# Altium footprint library AMA4B_adapter_board.PcbLib: 73 footprints (part 3 of 5)
Each footprint in its own frame and in the unit in brackets; x right, y up, seen from the top. Pads: shape width x height; smd on the part's side, far side on the other; paste and mask are expansions set on the pad; w line width, h text height; cw(c..) or ccw(c..) is an arc to the next point about the centre after c.
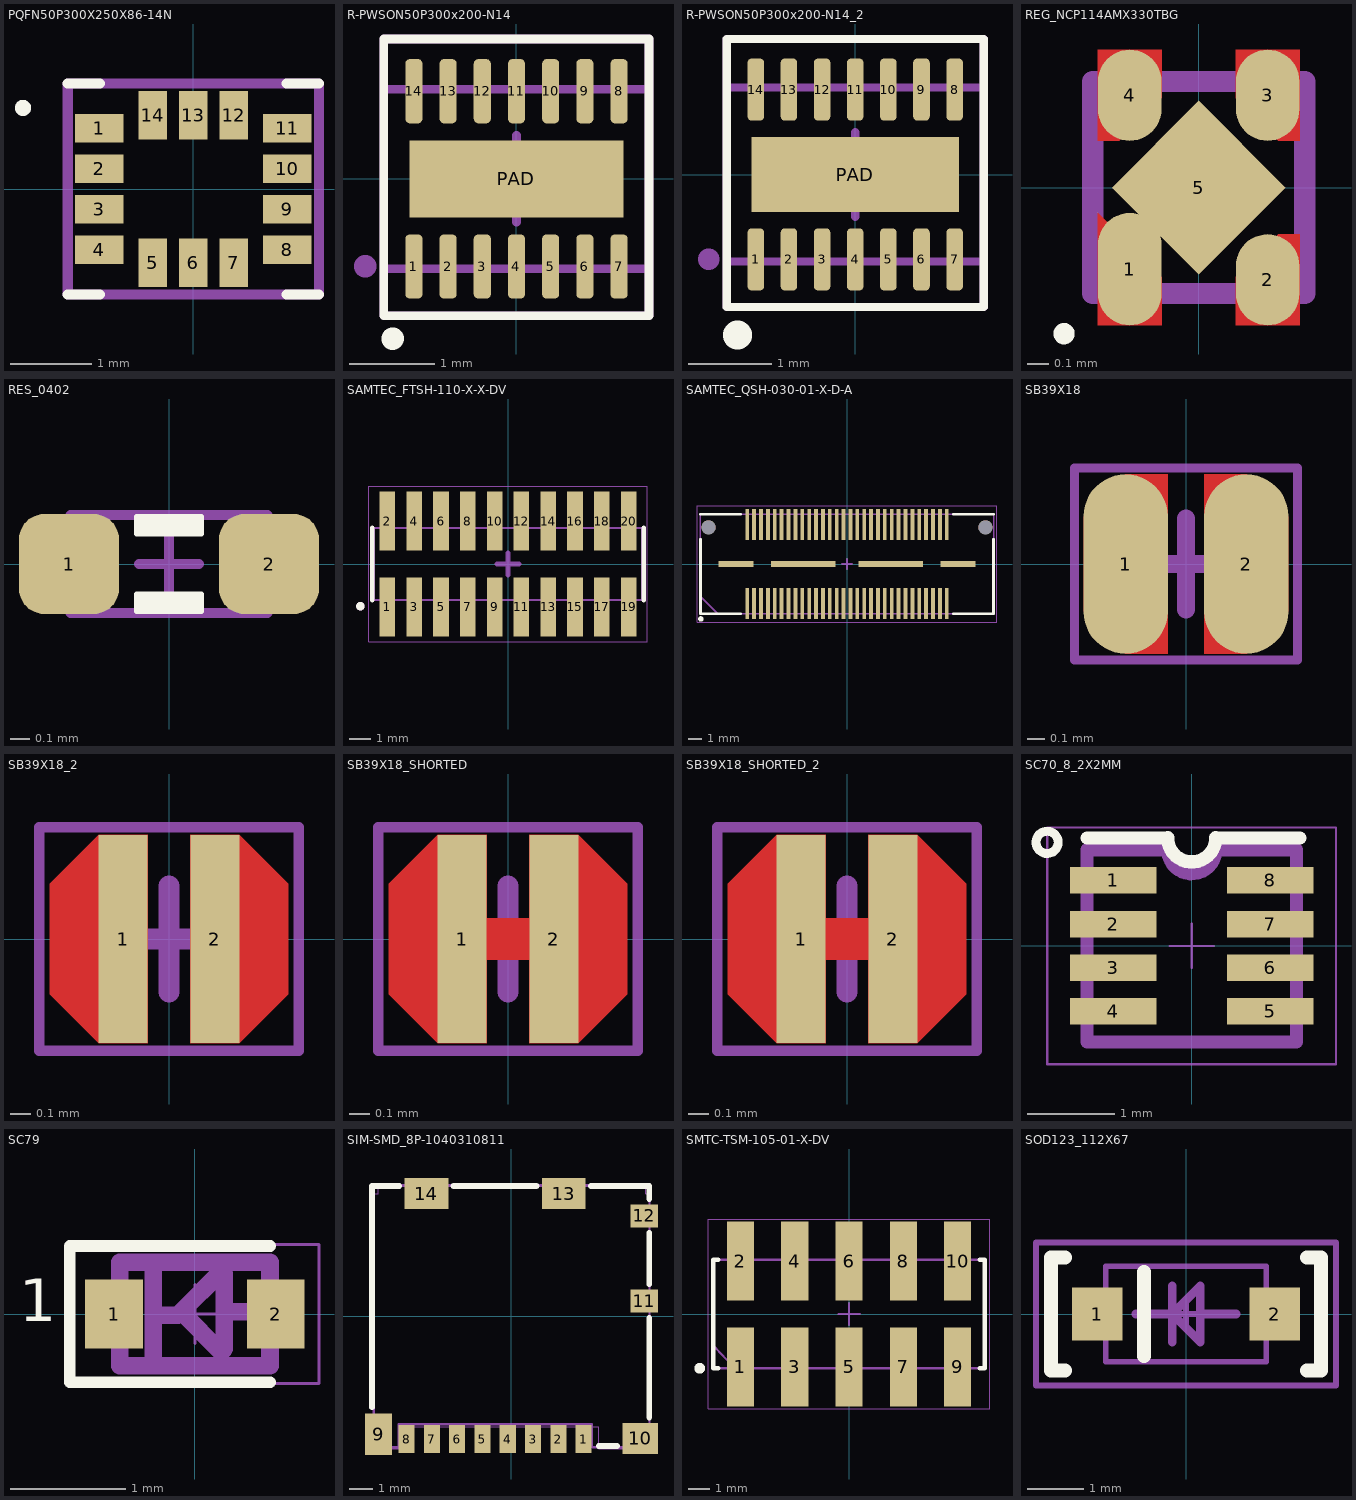
[diagram p2: the footprints below, top view; thin cyan lines are the x and y axes]

## PQFN50P300X250X86-14N [mm]
pads (14):
  rect 0.6x0.35 smd: 1(-1.16,0.75) 2(-1.16,0.25) 3(-1.16,-0.25) 4(-1.16,-0.75) 8(1.16,-0.75) 9(1.16,-0.25) 10(1.16,0.25) 11(1.16,0.75)
  rect 0.35x0.6 smd: 5(-0.5,-0.91) 6(0,-0.91) 7(0.5,-0.91) 12(0.5,0.91) 13(0,0.91) 14(-0.5,0.91)
Top Overlay:
  circle w0.1: c-2.1,1 r0.05
  lines w0.127: -1.55,-1.3 -1.15,-1.3 ; -1.55,1.3 -1.15,1.3 ; 1.15,-1.3 1.55,-1.3 ; 1.15,1.3 1.55,1.3
Top Assembly:
  lines w0.127: -1.55,-1.3 1.55,-1.3 1.55,1.3 -1.55,1.3 -1.55,-1.3
  text ".Designator" at -1.126,-0.113 h0.5
3D body "step_temp.STEP": height 0.86, standoff 0, extent -1.5,-1.25 1.5,1.25

## R-PWSON50P300x200-N14 [mm] "Texas Instruments DPU Package"
pads (15):
  rrect50% 0.2x0.75 smd mask+0.05: 1(-1.2,-1.025) 2(-0.8,-1.025) 3(-0.4,-1.025) 4(0,-1.025) 5(0.4,-1.025) 6(0.8,-1.025) 7(1.2,-1.025) 8(1.2,1.025) 9(0.8,1.025) 10(0.4,1.025) 11(0,1.025) 12(-0.4,1.025) 13(-0.8,1.025) 14(-1.2,1.025)
  rect 2.5x0.9 smd paste-1 mask+0.05: PAD(0,0)
Top Overlay:
  circle w0.254: c-1.449,-1.869 r0.004
  lines w0.1: -1.55,-1.6 1.55,-1.6 1.55,1.636 -1.55,1.636 -1.55,-1.6
Top Paste:
  rectangle: 0.125,-0.375 1.125,0.375
  rectangle: -1.125,-0.375 -0.125,0.375
Board Shape:
  circle w0.254: c-1.77,-1.023 r0.004
  lines w0.1: -1.55,-1.05 1.55,-1.05 1.55,1.05 -1.55,1.05 -1.55,-1.05
  text ".Designator" at 3.379,0.463 h1.52
Top Courtyard:
  lines w0.1: -1.55,-1.6 -1.55,1.636 1.55,1.636 1.55,-1.6 -1.55,-1.6
Top Component Center:
  lines w0.102: -0.508,0 0.508,0 ; 0,-0.508 0,0.508
3D body: height 0.8, standoff 0, extent -1.55,-1.05 1.55,1.05

## R-PWSON50P300x200-N14_2 [mm]
pads (15):
  rrect50% 0.2x0.75 smd mask+0.05: 1(-1.2,-1.025) 2(-0.8,-1.025) 3(-0.4,-1.025) 4(0,-1.025) 5(0.4,-1.025) 6(0.8,-1.025) 7(1.2,-1.025) 8(1.2,1.025) 9(0.8,1.025) 10(0.4,1.025) 11(0,1.025) 12(-0.4,1.025) 13(-0.8,1.025) 14(-1.2,1.025)
  rect 2.5x0.9 smd paste-1 mask+0.05: PAD(0,0)
Top Overlay:
  circle w0.254: c-1.421,-1.938 r0.048
  lines w0.1: -1.55,-1.6 1.55,-1.6 1.55,1.636 -1.55,1.636 -1.55,-1.6
Top Paste:
  rectangle: 0.125,-0.375 1.125,0.375
  rectangle: -1.125,-0.375 -0.125,0.375
Board Shape:
  circle w0.254: c-1.77,-1.023 r0.004
  lines w0.1: -1.55,-1.05 1.55,-1.05 1.55,1.05 -1.55,1.05 -1.55,-1.05
  text ".Designator" at 3.459,0.345 h1.52
Top Courtyard:
  lines w0.1: -1.55,-1.6 -1.55,1.636 1.55,1.636 1.55,-1.6 -1.55,-1.6
Top Component Center:
  lines w0.102: -0.508,0 0.508,0 ; 0,-0.508 0,0.508
3D body: height 0.8, standoff 0, extent -1.55,-1.05 1.55,1.05

## REG_NCP114AMX330TBG [mm]
pads (5):
  shape10 0.3x0.53 smd: 1(-0.325,-0.385)
  shape10 0.3x0.43 smd: 2(0.325,-0.435) 3(0.325,0.435) 4(-0.325,0.435)
  rect 0.58x0.58 smd rot 45 mask+0: 5(0,0)
Top Layer:
  region: 0.475,0.22 0.375,0.22 0.175,0.42 0.175,0.65 0.475,0.65
  region: -0.175,0.42 -0.375,0.22 -0.475,0.22 -0.475,0.65 -0.175,0.65
  region: -0.175,-0.42 -0.175,-0.65 -0.475,-0.65 -0.475,-0.12
  region: 0.475,-0.65 0.175,-0.65 0.175,-0.42 0.375,-0.22 0.475,-0.22
Top Overlay:
  circle w0.05: c-0.635,-0.689 r0.025
Top Paste:
  region: -0.175,0.42 -0.375,0.22 -0.475,0.22 -0.475,0.65 -0.175,0.65
  region: 0.475,0.22 0.375,0.22 0.175,0.42 0.175,0.65 0.475,0.65
  region: 0.475,-0.65 0.175,-0.65 0.175,-0.42 0.375,-0.22 0.475,-0.22
  region: -0.175,-0.42 -0.175,-0.65 -0.475,-0.65 -0.475,-0.12
Top Solder:
  region: 0.35,-0.351 -0.351,-0.351 -0.351,0.35 0.35,0.35
  region: -0.125,0.4 -0.35,0.175 -0.525,0.175 -0.525,0.7 -0.125,0.7
  region: 0.525,-0.7 0.125,-0.7 0.125,-0.4 0.35,-0.175 0.525,-0.175
  region: 0.525,0.175 0.35,0.175 0.125,0.4 0.125,0.7 0.525,0.7
  region: -0.125,-0.4 -0.125,-0.7 -0.525,-0.7 -0.525,-0.05 -0.475,-0.05
Top Assembly:
  lines w0.1: -0.5,-0.5 0.5,-0.5 0.5,0.5 -0.5,0.5 -0.5,-0.5
  text ".Designator" at -0.674,-0.068 h0.3
3D body "NCP114AMX330TBG.STEP": height 0.58, standoff -0.03, extent -0.5,-0.5 0.5,0.5

## RES_0402 [mil]
height 13.78
pads (2):
  rrect50% 20x20 smd: 1(-20,0) 2(20,0)
Top Overlay:
  region: -6.5,9.5 6.5,9.5 6.5,6 -6.5,6
  region: 6.5,-9.5 -6.5,-9.5 -6.5,-6 6.5,-6
  lines w1: -6.5,-9.5 -6.5,-6 6.5,-6 6.5,-9.5 -6.5,-9.5 ; -6.5,6 6.5,6 6.5,9.5 -6.5,9.5 -6.5,6
Board Shape:
  lines w2: -19.69,-9.84 -19.69,9.84 19.68,9.84 19.68,-9.84 -19.69,-9.84
  text ".Designator" at -44.34,-4.45 h19.68
Top Component Center:
  lines w2: -6,0 6,0 ; 0,-6 0,6
3D body "RESC1005X03L.step": height 13.78, standoff 0, extent -19.68,-9.84 19.69,9.85

## SAMTEC_FTSH-110-X-X-DV [mm]
pads (20):
  rect 0.74x2.79 smd: 1(-5.715,-2.035) 2(-5.715,2.035) 3(-4.445,-2.035) 4(-4.445,2.035) 5(-3.175,-2.035) 6(-3.175,2.035) 7(-1.905,-2.035) 8(-1.905,2.035) 9(-0.635,-2.035) 10(-0.635,2.035) 11(0.635,-2.035) 12(0.635,2.035) 13(1.905,-2.035) 14(1.905,2.035) 15(3.175,-2.035) 16(3.175,2.035) 17(4.445,-2.035) 18(4.445,2.035) 19(5.715,-2.035) 20(5.715,2.035)
Top Overlay:
  circle w0.2: c-7,-2 r0.1
  lines w0.2: -6.435,-1.715 -6.435,1.715 ; 6.435,-1.715 6.435,1.715
Board Shape:
  circle w0.2: c-7,-2 r0.1
  lines w0.1: -6.35,-1.715 6.35,-1.715 6.35,1.715 -6.35,1.715 -6.35,-1.715
  text ".Designator" at -3.434,-0.345 h1.52
Top Courtyard:
  lines w0.05: -6.6,-3.68 6.6,-3.68 6.6,3.68 -6.6,3.68 -6.6,-3.68
Top Component Center:
  lines w0.254: -0.508,0 0.508,0 ; 0,-0.508 0,0.508
3D body "FTSH-110-01-L-DV-K-P-TR.stp": height 6.58, standoff -0.41, extent -6.35,-4.445 6.35,2.921

## SAMTEC_QSH-030-01-X-D-A [mm]
pads (66):
  rect 0.279x2.27 smd mask+0.05: 01(-7.25,-2.865) 02(-7.25,2.865) 03(-6.75,-2.865) 04(-6.75,2.865) 05(-6.25,-2.865) 06(-6.25,2.865) 07(-5.75,-2.865) 08(-5.75,2.865) 09(-5.25,-2.865) 10(-5.25,2.865) 11(-4.75,-2.865) 12(-4.75,2.865) 13(-4.25,-2.865) 14(-4.25,2.865) 15(-3.75,-2.865) 16(-3.75,2.865) 17(-3.25,-2.865) 18(-3.25,2.865) 19(-2.75,-2.865) 20(-2.75,2.865) 21(-2.25,-2.865) 22(-2.25,2.865) 23(-1.75,-2.865) 24(-1.75,2.865) 25(-1.25,-2.865) 26(-1.25,2.865) 27(-0.75,-2.865) 28(-0.75,2.865) 29(-0.25,-2.865) 30(-0.25,2.865) 31(0.25,-2.865) 32(0.25,2.865) 33(0.75,-2.865) 34(0.75,2.865) 35(1.25,-2.865) 36(1.25,2.865) 37(1.75,-2.865) 38(1.75,2.865) 39(2.25,-2.865) 40(2.25,2.865) 41(2.75,-2.865) 42(2.75,2.865) 43(3.25,-2.865) 44(3.25,2.865) 45(3.75,-2.865) 46(3.75,2.865) 47(4.25,-2.865) 48(4.25,2.865) 49(4.75,-2.865) 50(4.75,2.865) 51(5.25,-2.865) 52(5.25,2.865) 53(5.75,-2.865) 54(5.75,2.865) 55(6.25,-2.865) 56(6.25,2.865) 57(6.75,-2.865) 58(6.75,2.865) 59(7.25,-2.865) 60(7.25,2.865)
  rect 2.54x0.43 smd mask+0.05: S1(-8.065,0) S4(8.065,0)
  rect 4.7x0.43 smd mask+0.05: S2(-3.175,0) S3(3.175,0)
  round 1.02 hole 1.02 unplated: ""(-10.065,2.67) ""(10.065,2.67)
Top Overlay:
  circle w0.2: c-10.621,-3.997 r0.1
  lines w0.2: -10.655,1.8 -10.655,-3.62 -7.75,-3.62 ; -10.655,3.62 -7.75,3.62 ; 7.75,-3.62 10.655,-3.62 10.655,1.8 ; 7.75,3.62 10.655,3.62
Board Shape:
  lines w0.1: -10.655,-3.62 10.655,-3.62 10.655,3.62 -10.655,3.62 -10.655,-3.62
  lines w0.127: -10.667,-2.354 -9.367,-3.653
  text ".Designator" at 0.218,-3.485 h1.52
Top Courtyard:
  lines w0.05: -10.905,-4.25 -10.905,4.25 10.905,4.25 10.905,-4.25 -10.905,-4.25
Top Component Center:
  lines w0.127: -0.381,0 0.381,0 ; 0,-0.381 0,0.381
3D body "QSH-030-01-L-D-A--3DModel-STEP-56544.STEP": height 3.05, standoff -0.95, extent -10.635,-3.747 10.635,3.747

## SB39X18 [mil] "SB39X18"
pads (2):
  shape10 18.5x39.4 smd: 1(-13.25,0) 2(13.25,0)
Top Layer:
  region: 22.5,10.4 22.5,-10.4 13.3,-19.7 4,-19.7 4,19.7 13.3,19.7
  region: -22.5,-10.4 -22.5,10.4 -13.3,19.7 -4,19.7 -4,-19.7 -13.3,-19.7
  region: -22.5,-10.4 -22.5,10.4 -13.3,19.7 -4,19.7 -4,-19.7 -13.3,-19.7
  region: 22.5,10.4 22.5,-10.4 13.3,-19.7 4,-19.7 4,19.7 13.3,19.7
Top Solder:
  region: 24.5,-11 24.5,11 14.4,21.1 0,21.1 0,-21.1 14.4,-21.1
  region: 24.5,-11 24.5,11 14.4,21.1 0,21.1 0,-21.1 14.4,-21.1
  region: -24.5,11 -24.5,-11 -14.4,-21.1 0,-21.1 0,21.1 -14.4,21.1
  region: -24.5,11 -24.5,-11 -14.4,-21.1 0,-21.1 0,21.1 -14.4,21.1
Board Shape:
  lines w2: -24.5,-21.1 24.5,-21.1 24.5,21.1 -24.5,21.1 -24.5,-21.1
  text "Solderbridge" at -20,11.5 h8
  text "No Assembly Req'd" at -24.5,-21.1 h8
Top Component Center:
  lines w4: -10,0 10,0 ; 0,-10 0,10

## SB39X18_2 [mm]
pads (2):
  rect 0.236x1 smd paste+0 mask+0.102: 1(-0.22,0) 2(0.22,0)
Top Layer:
  region: -0.572,-0.264 -0.572,0.264 -0.338,0.5 -0.102,0.5 -0.102,-0.5 -0.338,-0.5
  region: -0.572,-0.264 -0.572,0.264 -0.338,0.5 -0.102,0.5 -0.102,-0.5 -0.338,-0.5
  region: 0.572,0.264 0.572,-0.264 0.338,-0.5 0.102,-0.5 0.102,0.5 0.338,0.5
  region: 0.572,0.264 0.572,-0.264 0.338,-0.5 0.102,-0.5 0.102,0.5 0.338,0.5
Top Solder:
  region: -0.622,0.279 -0.622,-0.279 -0.366,-0.536 0,-0.536 0,0.536 -0.366,0.536
  region: -0.622,0.279 -0.622,-0.279 -0.366,-0.536 0,-0.536 0,0.536 -0.366,0.536
  region: 0.622,-0.279 0.622,0.279 0.366,0.536 0,0.536 0,-0.536 0.366,-0.536
  region: 0.622,-0.279 0.622,0.279 0.366,0.536 0,0.536 0,-0.536 0.366,-0.536
Board Shape:
  lines w0.051: -0.622,-0.536 -0.622,0.536 0.622,0.536 0.622,-0.536 -0.622,-0.536
  text "No Assembly Req'd" at -0.622,-0.536 h0.2
  text ".Designator" at 0.838,-0.787 h1.02
  text "Solderbridge" at -0.508,0.292 h0.2
Top Courtyard:
  lines w0.025: -0.622,-0.536 0.622,-0.536 0.622,0.536 -0.622,0.536 -0.622,-0.536
Top Component Center:
  lines w0.102: -0.254,0 0.254,0 ; 0,-0.254 0,0.254

## SB39X18_SHORTED [mm] "SB39X18_SHORTED"
pads (2):
  rect 0.236x1 smd paste+0 mask+0.102: 1(-0.22,0) 2(0.22,0)
Top Layer:
  rectangle: -0.481,-0.101 0.481,0.102
  region: 0.572,0.264 0.572,-0.264 0.338,-0.5 0.102,-0.5 0.102,0.5 0.338,0.5
  region: 0.572,0.264 0.572,-0.264 0.338,-0.5 0.102,-0.5 0.102,0.5 0.338,0.5
  region: -0.572,-0.264 -0.572,0.264 -0.338,0.5 -0.102,0.5 -0.102,-0.5 -0.338,-0.5
  region: -0.572,-0.264 -0.572,0.264 -0.338,0.5 -0.102,0.5 -0.102,-0.5 -0.338,-0.5
Top Solder:
  region: 0.622,-0.279 0.622,0.279 0.366,0.536 0,0.536 0,-0.536 0.366,-0.536
  region: 0.622,-0.279 0.622,0.279 0.366,0.536 0,0.536 0,-0.536 0.366,-0.536
  region: -0.622,0.279 -0.622,-0.279 -0.366,-0.536 0,-0.536 0,0.536 -0.366,0.536
  region: -0.622,0.279 -0.622,-0.279 -0.366,-0.536 0,-0.536 0,0.536 -0.366,0.536
Board Shape:
  lines w0.051: -0.622,-0.536 -0.622,0.536 0.622,0.536 0.622,-0.536 -0.622,-0.536
  text "Solderbridge" at -0.508,0.292 h0.2
  text ".Designator" at 0.828,-0.841 h1.02
  text "No Assembly Req'd" at -0.622,-0.536 h0.2
Top Courtyard:
  lines w0.025: -0.622,-0.536 -0.622,0.536 0.622,0.536 0.622,-0.536 -0.622,-0.536
Top Component Center:
  lines w0.102: -0.254,0 0.254,0 ; 0,-0.254 0,0.254

## SB39X18_SHORTED_2 [mm]
pads (2):
  rect 0.236x1 smd paste+0 mask+0.102: 1(-0.22,0) 2(0.22,0)
Top Layer:
  rectangle: -0.481,-0.101 0.481,0.102
  region: 0.572,0.264 0.572,-0.264 0.338,-0.5 0.102,-0.5 0.102,0.5 0.338,0.5
  region: 0.572,0.264 0.572,-0.264 0.338,-0.5 0.102,-0.5 0.102,0.5 0.338,0.5
  region: -0.572,-0.264 -0.572,0.264 -0.338,0.5 -0.102,0.5 -0.102,-0.5 -0.338,-0.5
  region: -0.572,-0.264 -0.572,0.264 -0.338,0.5 -0.102,0.5 -0.102,-0.5 -0.338,-0.5
Top Solder:
  region: 0.622,-0.279 0.622,0.279 0.366,0.536 0,0.536 0,-0.536 0.366,-0.536
  region: 0.622,-0.279 0.622,0.279 0.366,0.536 0,0.536 0,-0.536 0.366,-0.536
  region: -0.622,0.279 -0.622,-0.279 -0.366,-0.536 0,-0.536 0,0.536 -0.366,0.536
  region: -0.622,0.279 -0.622,-0.279 -0.366,-0.536 0,-0.536 0,0.536 -0.366,0.536
Board Shape:
  lines w0.051: -0.622,-0.536 0.622,-0.536 0.622,0.536 -0.622,0.536 -0.622,-0.536
  text "No Assembly Req'd" at -0.622,-0.536 h0.2
  text "Solderbridge" at -0.508,0.292 h0.2
  text ".Designator" at 0.968,-0.311 h1.02
Top Courtyard:
  lines w0.025: -0.622,-0.536 -0.622,0.536 0.622,0.536 0.622,-0.536 -0.622,-0.536
Top Component Center:
  lines w0.102: -0.254,0 0.254,0 ; 0,-0.254 0,0.254

## SC70_8_2X2MM [mil] "SC70_8_2X2MM"
pads (8):
  rect 39x12 smd mask+1.97: 1(-35.35,29.5) 2(-35.35,9.8) 3(-35.35,-9.8) 4(-35.35,-29.5) 5(35.45,-29.5) 6(35.45,-9.8) 7(35.45,9.8) 8(35.45,29.5)
Top Overlay:
  circle w4: c-65.11,46.64 r5
  lines w6: -47.15,48.6 -11.35,48.6 ; -10.8,48.65 ccw(c0.05,48.65) 10.9,48.65 ; 11.4,48.62 48.7,48.62
Board Shape:
  lines w6: -11.35,43.3 -47.15,43.3 -47.15,-43.3 47.25,-43.3 47.25,43.3 10.05,43.3 ; -10.65,45 ccw(c0.06,43.32) -9.55,38.3 ccw(c0.05,43.38) 10.66,45.7
  text "1" at -79.05,29.8 h25
  text ".Designator" at -90.13,7.51 h40
Top Courtyard:
  lines w1: -65.05,-53.3 65.05,-53.3 65.05,53.3 -65.05,53.3 -65.05,-53.3
Top Component Center:
  lines w1: -9.95,0 10.05,0 ; 0.05,-10 0.05,10
3D body: height 150, standoff 0, extent -55.05,-43.3 55.05,43.3

## SC79 [mm] "SC79"
pads (2):
  rect 0.5x0.6 smd paste-0.05 mask+0.05: 1(-0.7,0) 2(0.7,0)
Top Overlay:
  lines w0.102: 0.652,-0.591 -1.085,-0.591 -1.085,0.588 0.652,0.588
  text "1" at -1.523,-0.184 h0.64
Board Shape:
  lines w0.152: -0.361,-0.442 -0.361,0.381 ; -0.348,-0.01 -0.147,-0.01 -0.119,0.018 ; 0.254,0.018 0.577,0.018 ; -0.119,0.018 0.229,-0.33 0.254,-0.302 0.254,0.351 0.213,0.351 -0.119,0.018 ; -0.65,-0.45 0.65,-0.45 0.65,0.45 -0.65,0.45 -0.65,-0.45
  text "1" at -1.473,-0.305 h0.64
  text ".Designator" at -1.7,0.9 h1.02
Top Courtyard:
  lines w0.025: -1.075,-0.6 -1.075,0.6 1.075,0.6 1.075,-0.6 -1.075,-0.6
Top Component Center:
  lines w0.025: -0.254,0 0.254,0 ; 0,-0.254 0,0.254

## SIM-SMD_8P-1040310811 [mm]
pads (14):
  rect 0.7x1.2 smd paste+0 mask+0.051: 1(3.138,-5.337) 2(2.037,-5.337) 3(0.938,-5.337) 4(-0.162,-5.337) 5(-1.263,-5.337) 6(-2.363,-5.337) 7(-3.462,-5.337) 8(-4.562,-5.337)
  rect 1.17x1.8 smd paste+0 mask+0.051: 9(-5.773,-5.138)
  rect 1.55x1.35 smd paste+0 mask+0.051: 10(5.598,-5.313)
  rect 1.2x1 smd paste+0 mask+0.051: 11(5.773,0.663) 12(5.773,4.363)
  rect 1.9x1.35 smd paste+0 mask+0.051: 13(2.273,5.337) 14(-3.697,5.337)
Top Overlay:
  lines w0.254: -6.071,-3.956 -6.071,5.665 -4.879,5.665 ; -2.516,5.665 1.091,5.665 ; 3.454,5.665 5.994,5.665 5.994,5.094 ; 3.794,-5.638 4.591,-5.638 ; 5.994,-4.406 5.994,-0.069 ; 5.994,1.394 5.994,3.631
Top Assembly:
  lines w0.1: -6,5.7 6,5.7 ; -6,5.7 -6,5.7 ; -6,5.7 -6,-5.7 -4.9,-5.7 ; -4.9,-5.7 -4.9,-4.7 3.5,-4.7 3.5,-5.7 ; -4.9,-5.7 -4.9,-5.7 ; 3.5,-5.7 6,-5.7 6,5.7 ; 3.5,-5.7 3.5,-5.7 ; 6,5.7 6,5.7
  text ".Designator" at -3.434,-0.345 h1.52
Top Courtyard:
  region: 6.002,-5.69 5.977,-5.69 5.942,-5.725 5.942,-5.775 5.977,-5.81 6.002,-5.81 6.027,-5.81 6.062,-5.775 6.062,-5.725 6.027,-5.69 6.002,-5.69
  region: -5.963,-4.437 -5.313,-4.437 -5.313,-5.738 -5.963,-5.738
  region: 5.002,-4.9 6.002,-4.9 6.002,-5.75 5.002,-5.75
  region: 5.352,0.988 6.002,0.988 6.002,0.338 5.352,0.338
  region: 5.352,4.688 6.002,4.688 6.002,4.038 5.352,4.038
  region: 1.572,5.65 2.972,5.65 2.972,4.75 1.572,4.75
  region: -4.397,5.65 -2.997,5.65 -2.997,4.75 -4.397,4.75
  region: -4.732,-4.75 -4.392,-4.75 -4.392,-5.7 -4.732,-5.7
  region: -3.632,-4.75 -3.292,-4.75 -3.292,-5.7 -3.632,-5.7
  region: -2.533,-4.75 -2.193,-4.75 -2.193,-5.7 -2.533,-5.7
  region: -1.432,-4.75 -1.092,-4.75 -1.092,-5.7 -1.432,-5.7
  region: -0.332,-4.75 0.008,-4.75 0.008,-5.7 -0.332,-5.7
  region: 0.768,-4.75 1.108,-4.75 1.108,-5.7 0.768,-5.7
  region: 1.867,-4.75 2.207,-4.75 2.207,-5.7 1.867,-5.7
  region: 2.968,-4.75 3.308,-4.75 3.308,-5.7 2.968,-5.7
  lines w0.051: -5.95,-5.75 -4.86,-5.75 -4.86,-4.8 3.8,-4.8 3.8,-5.75 6,-5.75 6,5.33 5.85,5.33 5.85,5.65 -5.8,5.65 -5.8,5.33 -5.95,5.33 -5.95,-5.75
3D body "USUp-SIM1.step": height 1.47, standoff 0, extent -5.975,-5.55 5.975,5.85

## SMTC-TSM-105-01-X-DV [mm] "Double Row Gullwing ASM, 2x5 Pins, Vertical, 2.54mm Pitch, Male"
height 9.9
pads (10):
  rect 1.27x3.68 smd: 1(-5.08,-2.475) 2(-5.08,2.475) 3(-2.54,-2.475) 4(-2.54,2.475) 5(0,-2.475) 6(0,2.475) 7(2.54,-2.475) 8(2.54,2.475) 9(5.08,-2.475) 10(5.08,2.475)
Top Overlay:
  circle w0.25: c-6.985,-2.54 r0.125
  lines w0.2: -6.115,-2.54 -6.35,-2.54 -6.35,2.54 -6.115,2.54 ; 6.115,-2.54 6.35,-2.54 6.35,2.54 6.115,2.54
Board Shape:
  lines w0.1: -6.35,-2.54 6.35,-2.54 6.35,2.54 -6.35,2.54 -6.35,-2.54
  lines w0.102: -6.35,-1.475 -5.346,-2.54
  text ".Designator" at -2.289,-0.23 h1.02
Top Courtyard:
  lines w0.05: -6.575,-4.44 -6.575,4.44 6.575,4.44 6.575,-4.44 -6.575,-4.44
Top Component Center:
  lines w0.1: -0.5,0 0.5,0 ; 0,-0.5 0,0.5
3D body "TSM-105-01-X-DV.step": height 9.65, standoff 0, extent -6.35,-3.683 6.35,3.683

## SOD123_112X67 [mil] "SOD123_112X67"
pads (2):
  rect 35.4x37.4 smd: 1(-62,0) 2(62,0)
Top Overlay:
  lines w9.8: -84.6,-39.4 -94.5,-39.4 -94.5,39.4 -84.6,39.4 ; -29.5,-29.5 -29.5,29.5 ; 84.6,-39.4 94.5,-39.4 94.5,39.4 84.6,39.4
Board Shape:
  lines w4: -56.1,-33.5 -56.1,33.5 56.1,33.5 56.1,-33.5 -56.1,-33.5
  lines w6: -35,0 -9.6,0 ; -9.6,-19.7 -9.6,19.7 ; 10,0 35,0 ; -9.6,0 10,-19.7 10,19.7 -9.6,0
  text ".Designator" at -1,40 h40
Top Courtyard:
  lines w4: -105,-50 -105,50 105,50 105,-50 -105,-50
Top Component Center:
  lines w4: -10,0 10,0 ; 0,-10 0,10
3D body "SOD-323.STEP": height 39.37, standoff 1.73, extent -51.62,-26.34 52.63,24.84